# Altium schematic symbol library SCHLIB.SchLib: 2608 symbols (part 13 of 20)
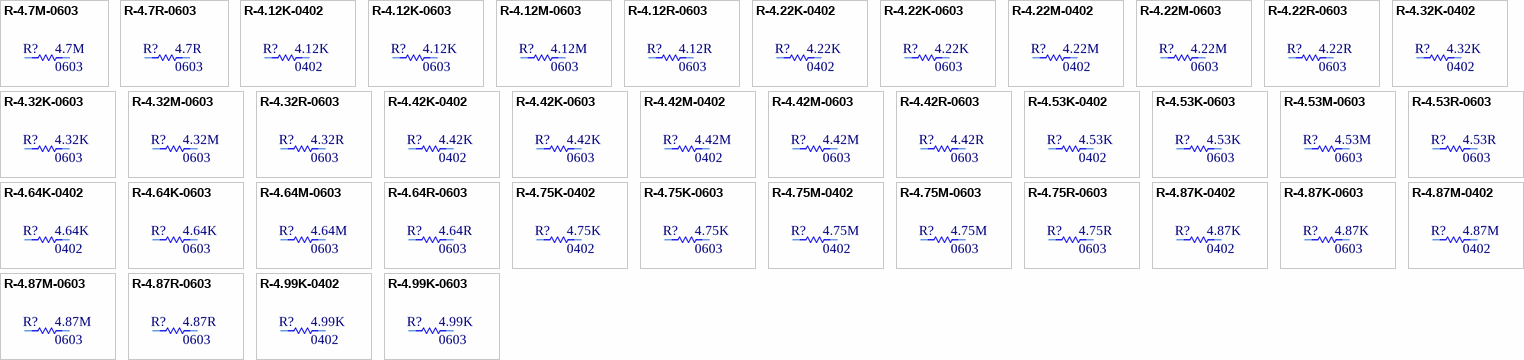
[diagram p95: symbols R-4.7M-0603 to R-4.99K-0603]

## R-4.75M-0402
designator R?, comment Package: 0402  (hidden comment: 4.75M)
RES 4.75M OHM 1% 1/16W 0402; Manufacturer Part Number: RC0402FR-074M75L; Manufacturer: YAGEO; Tolerance: 0.01; Power: 0.063W; Temperature Coefficient: ±100ppm/°C; Object  Type: Part; Design Item ID: R-4.75M-0402; Value: 4.75M; Composition: Thick Film; Features: Moisture Resistant; Operating Temperature: -55°C ~ 155°C; Height - Seated (Max): 0.40mm; Category: Resistor
footprint R0402
pins: 1, 2

## R-4.75M-0603
designator R?, comment Package: 0603  (hidden comment: 4.75M)
RES SMD 4.75M OHM 1% 1/10W 0603; Manufacturer Part Number: CRCW06034M75FKEA; Manufacturer: Vishay Dale; Tolerance: 0.01; Power: 0.1W; Temperature Coefficient: ±100ppm/°C; Object  Type: Part; Design Item ID: R-4.75M-0603; Value: 4.75M; Composition: Thick Film; Features: Automotive AEC-Q200; Operating Temperature: -55°C ~ 155°C; Height - Seated (Max): 0.50mm; Category: Resistor
footprint R0603
pins: 1, 2

## R-4.75R-0603
designator R?, comment Package: 0603  (hidden comment: 4.75R)
RES SMD 4.75 OHM 1% 1/10W 0603; Manufacturer Part Number: CRCW06034R75FKEA; Manufacturer: Vishay Dale; Tolerance: 0.01; Power: 0.1W; Temperature Coefficient: ±100ppm/°C; Object  Type: Part; Design Item ID: R-4.75R-0603; Value: 4.75R; Composition: Thick Film; Features: Automotive AEC-Q200; Operating Temperature: -55°C ~ 155°C; Height - Seated (Max): 0.50mm; Category: Resistor
footprint R0603
pins: 1, 2

## R-4.87K-0402
designator R?, comment Package: 0402  (hidden comment: 4.87K)
RES 4.87K OHM 1% 1/16W 0402; Manufacturer Part Number: RC0402FR-074K87L; Manufacturer: YAGEO; Tolerance: 0.01; Power: 0.063W; Temperature Coefficient: ±100ppm/°C; Object  Type: Part; Design Item ID: R-4.87K-0402; Value: 4.87K; Composition: Thick Film; Features: Moisture Resistant; Operating Temperature: -55°C ~ 155°C; Height - Seated (Max): 0.40mm; Category: Resistor
footprint R0402
pins: 1, 2

## R-4.87K-0603
designator R?, comment Package: 0603  (hidden comment: 4.87K)
RES SMD 4.87K OHM 1% 1/10W 0603; Manufacturer Part Number: CRCW06034K87FKEA; Manufacturer: Vishay Dale; Tolerance: 0.01; Power: 0.1W; Temperature Coefficient: ±100ppm/°C; Object  Type: Part; Design Item ID: R-4.87K-0603; Value: 4.87K; Composition: Thick Film; Features: Automotive AEC-Q200; Operating Temperature: -55°C ~ 155°C; Height - Seated (Max): 0.50mm; Category: Resistor
footprint R0603
pins: 1, 2

## R-4.87M-0402
designator R?, comment Package: 0402  (hidden comment: 4.87M)
RES 4.87M OHM 1% 1/16W 0402; Manufacturer Part Number: RC0402FR-074M87L; Manufacturer: YAGEO; Tolerance: 0.01; Power: 0.063W; Temperature Coefficient: ±100ppm/°C; Object  Type: Part; Design Item ID: R-4.87M-0402; Value: 4.87M; Composition: Thick Film; Features: Moisture Resistant; Operating Temperature: -55°C ~ 155°C; Height - Seated (Max): 0.40mm; Category: Resistor
footprint R0402
pins: 1, 2

## R-4.87M-0603
designator R?, comment Package: 0603  (hidden comment: 4.87M)
RES SMD 4.87M OHM 1% 1/10W 0603; Manufacturer Part Number: CRCW06034M87FKEA; Manufacturer: Vishay Dale; Tolerance: 0.01; Power: 0.1W; Temperature Coefficient: ±100ppm/°C; Object  Type: Part; Design Item ID: R-4.87M-0603; Value: 4.87M; Composition: Thick Film; Features: Automotive AEC-Q200; Operating Temperature: -55°C ~ 155°C; Height - Seated (Max): 0.50mm; Category: Resistor
footprint R0603
pins: 1, 2

## R-4.87R-0603
designator R?, comment Package: 0603  (hidden comment: 4.87R)
RES SMD 4.87 OHM 1% 1/10W 0603; Manufacturer Part Number: CRCW06034R87FKEA; Manufacturer: Vishay Dale; Tolerance: 0.01; Power: 0.1W; Temperature Coefficient: ±100ppm/°C; Object  Type: Part; Design Item ID: R-4.87R-0603; Value: 4.87R; Composition: Thick Film; Features: Automotive AEC-Q200; Operating Temperature: -55°C ~ 155°C; Height - Seated (Max): 0.50mm; Category: Resistor
footprint R0603
pins: 1, 2

## R-4.99K-0402
designator R?, comment Package: 0402  (hidden comment: 4.99K)
RES 4.99K OHM 1% 1/16W 0402; Manufacturer Part Number: RC0402FR-074K99L; Manufacturer: YAGEO; Tolerance: 0.01; Power: 0.063W; Temperature Coefficient: ±100ppm/°C; Object  Type: Part; Design Item ID: R-4.99K-0402; Value: 4.99K; Composition: Thick Film; Features: Moisture Resistant; Operating Temperature: -55°C ~ 155°C; Height - Seated (Max): 0.40mm; Category: Resistor
footprint R0402
pins: 1, 2

## R-4.99K-0603
designator R?, comment Package: 0603  (hidden comment: 4.99K)
RES SMD 4.99K OHM 1% 1/10W 0603; Manufacturer Part Number: CRCW06034K99FKEA; Manufacturer: Vishay Dale; Tolerance: 0.01; Power: 0.1W; Temperature Coefficient: ±100ppm/°C; Object  Type: Part; Design Item ID: R-4.99K-0603; Value: 4.99K; Composition: Thick Film; Features: Automotive AEC-Q200; Operating Temperature: -55°C ~ 155°C; Height - Seated (Max): 0.50mm; Category: Resistor
footprint R0603
pins: 1, 2

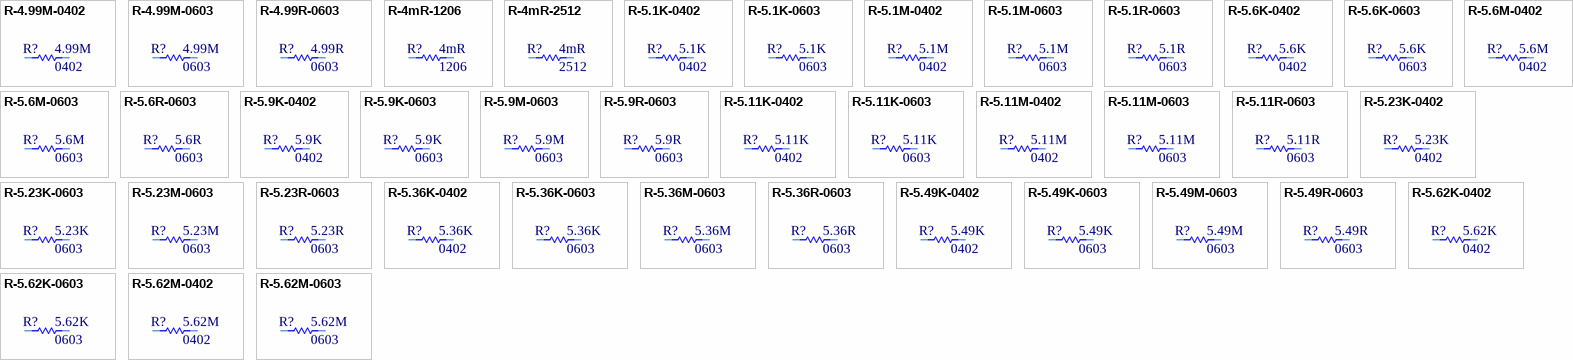
[diagram p53: symbols R-4.99M-0402 to R-5.62M-0603]

## R-4.99M-0402
designator R?, comment Package: 0402  (hidden comment: 4.99M)
RES 4.99M OHM 1% 1/16W 0402; Manufacturer Part Number: RC0402FR-074M99L; Manufacturer: YAGEO; Tolerance: 0.01; Power: 0.063W; Temperature Coefficient: ±100ppm/°C; Object  Type: Part; Design Item ID: R-4.99M-0402; Value: 4.99M; Composition: Thick Film; Features: Moisture Resistant; Operating Temperature: -55°C ~ 155°C; Height - Seated (Max): 0.40mm; Category: Resistor
footprint R0402
pins: 1, 2

## R-4.99M-0603
designator R?, comment Package: 0603  (hidden comment: 4.99M)
RES SMD 4.99M OHM 1% 1/10W 0603; Manufacturer Part Number: CRCW06034M99FKEA; Manufacturer: Vishay Dale; Tolerance: 0.01; Power: 0.1W; Temperature Coefficient: ±100ppm/°C; Object  Type: Part; Design Item ID: R-4.99M-0603; Value: 4.99M; Composition: Thick Film; Features: Automotive AEC-Q200; Operating Temperature: -55°C ~ 155°C; Height - Seated (Max): 0.50mm; Category: Resistor
footprint R0603
pins: 1, 2

## R-4.99R-0603
designator R?, comment Package: 0603  (hidden comment: 4.99R)
RES SMD 4.99 OHM 1% 1/10W 0603; Manufacturer Part Number: CRCW06034R99FKEA; Manufacturer: Vishay Dale; Tolerance: 0.01; Power: 0.1W; Temperature Coefficient: ±100ppm/°C; Object  Type: Part; Design Item ID: R-4.99R-0603; Value: 4.99R; Composition: Thick Film; Features: Automotive AEC-Q200; Operating Temperature: -55°C ~ 155°C; Height - Seated (Max): 0.50mm; Category: Resistor
footprint R0603
pins: 1, 2

## R-4mR-1206
designator R?, comment Package: 1206  (hidden comment: 4mR)
RES 0.004 OHM 1% 1/4W 1206; Manufacturer Part Number: WSL12064L000FEA; Manufacturer: Vishay Dale; Tolerance: 0.01; Power: 0.25W; Temperature Coefficient: ±150ppm/°C; Object  Type: Part; Design Item ID: R-4mR-1206; Value: 4mR; Composition: Metal Element; Features: Anti-Sulfur, Automotive AEC-Q200, Current Sense, Moisture Resistant, Pulse Withstanding; Operating Temperature: -65°C ~ 170°C; Height - Seated (Max): 0.89mm; Category: Resistor
footprint R1206
pins: 1, 2

## R-4mR-2512
designator R?, comment Package: 2512  (hidden comment: 4mR)
RES 0.004 OHM 1% 1W 2512; Manufacturer Part Number: WSL25124L000FEA; Manufacturer: Vishay Dale; Tolerance: 0.01; Temperature Coefficient: ±150ppm/°C; Object  Type: Part; Design Item ID: R-4mR-2512; Value: 4mR; Power: 1W; Composition: Metal Element; Features: Anti-Sulfur, Automotive AEC-Q200, Current Sense, Moisture Resistant, Pulse Withstanding; Operating Temperature: -65°C ~ 170°C; Height - Seated (Max): 0.89mm; Category: Resistor
footprint R2512
pins: 1, 2

## R-5.1K-0402
designator R?, comment Package: 0402  (hidden comment: 5.1K)
RES 5.1K OHM 1% 1/16W 0402; Manufacturer Part Number: RC0402FR-075K1L; Manufacturer: YAGEO; Tolerance: 0.01; Power: 0.063W; Temperature Coefficient: ±100ppm/°C; Object  Type: Part; Design Item ID: R-5.1K-0402; Value: 5.1K; Composition: Thick Film; Features: Moisture Resistant; Operating Temperature: -55°C ~ 155°C; Height - Seated (Max): 0.40mm; Category: Resistor
footprint R0402
pins: 1, 2

## R-5.1K-0603
designator R?, comment Package: 0603  (hidden comment: 5.1K)
RES SMD 5.1K OHM 1% 1/10W 0603; Manufacturer Part Number: CRCW06035K10FKEA; Manufacturer: Vishay Dale; Tolerance: 0.01; Power: 0.1W; Temperature Coefficient: ±100ppm/°C; Object  Type: Part; Design Item ID: R-5.1K-0603; Value: 5.1K; Composition: Thick Film; Features: Automotive AEC-Q200; Operating Temperature: -55°C ~ 155°C; Height - Seated (Max): 0.50mm; Category: Resistor
footprint R0603
pins: 1, 2

## R-5.1M-0402
designator R?, comment Package: 0402  (hidden comment: 5.1M)
RES 5.1M OHM 1% 1/16W 0402; Manufacturer Part Number: RC0402FR-075M1L; Manufacturer: YAGEO; Tolerance: 0.01; Power: 0.063W; Temperature Coefficient: ±100ppm/°C; Object  Type: Part; Design Item ID: R-5.1M-0402; Value: 5.1M; Composition: Thick Film; Features: Moisture Resistant; Operating Temperature: -55°C ~ 155°C; Height - Seated (Max): 0.40mm; Category: Resistor
footprint R0402
pins: 1, 2

## R-5.1M-0603
designator R?, comment Package: 0603  (hidden comment: 5.1M)
RES SMD 5.1M OHM 1% 1/10W 0603; Manufacturer Part Number: CRCW06035M10FKEA; Manufacturer: Vishay Dale; Tolerance: 0.01; Power: 0.1W; Temperature Coefficient: ±100ppm/°C; Object  Type: Part; Design Item ID: R-5.1M-0603; Value: 5.1M; Composition: Thick Film; Features: Automotive AEC-Q200; Operating Temperature: -55°C ~ 155°C; Height - Seated (Max): 0.50mm; Category: Resistor
footprint R0603
pins: 1, 2

## R-5.1R-0603
designator R?, comment Package: 0603  (hidden comment: 5.1R)
RES SMD 5.1 OHM 1% 1/10W 0603; Manufacturer Part Number: CRCW06035R10FKEA; Manufacturer: Vishay Dale; Tolerance: 0.01; Power: 0.1W; Temperature Coefficient: ±100ppm/°C; Object  Type: Part; Design Item ID: R-5.1R-0603; Value: 5.1R; Composition: Thick Film; Features: Automotive AEC-Q200; Operating Temperature: -55°C ~ 155°C; Height - Seated (Max): 0.50mm; Category: Resistor
footprint R0603
pins: 1, 2

## R-5.6K-0402
designator R?, comment Package: 0402  (hidden comment: 5.6K)
RES 5.6K OHM 1% 1/16W 0402; Manufacturer Part Number: RC0402FR-075K6L; Manufacturer: YAGEO; Tolerance: 0.01; Power: 0.063W; Temperature Coefficient: ±100ppm/°C; Object  Type: Part; Design Item ID: R-5.6K-0402; Value: 5.6K; Composition: Thick Film; Features: Moisture Resistant; Operating Temperature: -55°C ~ 155°C; Height - Seated (Max): 0.40mm; Category: Resistor
footprint R0402
pins: 1, 2

## R-5.6K-0603
designator R?, comment Package: 0603  (hidden comment: 5.6K)
RES SMD 5.6K OHM 1% 1/10W 0603; Manufacturer Part Number: CRCW06035K60FKEA; Manufacturer: Vishay Dale; Tolerance: 0.01; Power: 0.1W; Temperature Coefficient: ±100ppm/°C; Object  Type: Part; Design Item ID: R-5.6K-0603; Value: 5.6K; Composition: Thick Film; Features: Automotive AEC-Q200; Operating Temperature: -55°C ~ 155°C; Height - Seated (Max): 0.50mm; Category: Resistor
footprint R0603
pins: 1, 2

## R-5.6M-0402
designator R?, comment Package: 0402  (hidden comment: 5.6M)
RES 5.6M OHM 1% 1/16W 0402; Manufacturer Part Number: RC0402FR-075M6L; Manufacturer: YAGEO; Tolerance: 0.01; Power: 0.063W; Temperature Coefficient: ±100ppm/°C; Object  Type: Part; Design Item ID: R-5.6M-0402; Value: 5.6M; Composition: Thick Film; Features: Moisture Resistant; Operating Temperature: -55°C ~ 155°C; Height - Seated (Max): 0.40mm; Category: Resistor
footprint R0402
pins: 1, 2

## R-5.6M-0603
designator R?, comment Package: 0603  (hidden comment: 5.6M)
RES SMD 5.6M OHM 1% 1/10W 0603; Manufacturer Part Number: CRCW06035M60FKEA; Manufacturer: Vishay Dale; Tolerance: 0.01; Power: 0.1W; Temperature Coefficient: ±100ppm/°C; Object  Type: Part; Design Item ID: R-5.6M-0603; Value: 5.6M; Composition: Thick Film; Features: Automotive AEC-Q200; Operating Temperature: -55°C ~ 155°C; Height - Seated (Max): 0.50mm; Category: Resistor
footprint R0603
pins: 1, 2

## R-5.6R-0603
designator R?, comment Package: 0603  (hidden comment: 5.6R)
RES SMD 5.6 OHM 1% 1/10W 0603; Manufacturer Part Number: CRCW06035R60FKEA; Manufacturer: Vishay Dale; Tolerance: 0.01; Power: 0.1W; Temperature Coefficient: ±100ppm/°C; Object  Type: Part; Design Item ID: R-5.6R-0603; Value: 5.6R; Composition: Thick Film; Features: Automotive AEC-Q200; Operating Temperature: -55°C ~ 155°C; Height - Seated (Max): 0.50mm; Category: Resistor
footprint R0603
pins: 1, 2

## R-5.9K-0402
designator R?, comment Package: 0402  (hidden comment: 5.9K)
RES 5.9K OHM 1% 1/16W 0402; Manufacturer Part Number: RC0402FR-075K9L; Manufacturer: YAGEO; Tolerance: 0.01; Power: 0.063W; Temperature Coefficient: ±100ppm/°C; Object  Type: Part; Design Item ID: R-5.9K-0402; Value: 5.9K; Composition: Thick Film; Features: Moisture Resistant; Operating Temperature: -55°C ~ 155°C; Height - Seated (Max): 0.40mm; Category: Resistor
footprint R0402
pins: 1, 2

## R-5.9K-0603
designator R?, comment Package: 0603  (hidden comment: 5.9K)
RES SMD 5.9K OHM 1% 1/10W 0603; Manufacturer Part Number: CRCW06035K90FKEA; Manufacturer: Vishay Dale; Tolerance: 0.01; Power: 0.1W; Temperature Coefficient: ±100ppm/°C; Object  Type: Part; Design Item ID: R-5.9K-0603; Value: 5.9K; Composition: Thick Film; Features: Automotive AEC-Q200; Operating Temperature: -55°C ~ 155°C; Height - Seated (Max): 0.50mm; Category: Resistor
footprint R0603
pins: 1, 2

## R-5.9M-0603
designator R?, comment Package: 0603  (hidden comment: 5.9M)
RES SMD 5.9M OHM 1% 1/10W 0603; Manufacturer Part Number: CRCW06035M90FKEA; Manufacturer: Vishay Dale; Tolerance: 0.01; Power: 0.1W; Temperature Coefficient: ±100ppm/°C; Object  Type: Part; Design Item ID: R-5.9M-0603; Value: 5.9M; Composition: Thick Film; Features: Automotive AEC-Q200; Operating Temperature: -55°C ~ 155°C; Height - Seated (Max): 0.50mm; Category: Resistor
footprint R0603
pins: 1, 2

## R-5.9R-0603
designator R?, comment Package: 0603  (hidden comment: 5.9R)
RES SMD 5.9 OHM 1% 1/10W 0603; Manufacturer Part Number: CRCW06035R90FKEA; Manufacturer: Vishay Dale; Tolerance: 0.01; Power: 0.1W; Temperature Coefficient: ±100ppm/°C; Object  Type: Part; Design Item ID: R-5.9R-0603; Value: 5.9R; Composition: Thick Film; Features: Automotive AEC-Q200; Operating Temperature: -55°C ~ 155°C; Height - Seated (Max): 0.50mm; Category: Resistor
footprint R0603
pins: 1, 2

## R-5.11K-0402
designator R?, comment Package: 0402  (hidden comment: 5.11K)
RES 5.11K OHM 1% 1/16W 0402; Manufacturer Part Number: RC0402FR-075K11L; Manufacturer: YAGEO; Tolerance: 0.01; Power: 0.063W; Temperature Coefficient: ±100ppm/°C; Object  Type: Part; Design Item ID: R-5.11K-0402; Value: 5.11K; Composition: Thick Film; Features: Moisture Resistant; Operating Temperature: -55°C ~ 155°C; Height - Seated (Max): 0.40mm; Category: Resistor
footprint R0402
pins: 1, 2

## R-5.11K-0603
designator R?, comment Package: 0603  (hidden comment: 5.11K)
RES SMD 5.11K OHM 1% 1/10W 0603; Manufacturer Part Number: CRCW06035K11FKEA; Manufacturer: Vishay Dale; Tolerance: 0.01; Power: 0.1W; Temperature Coefficient: ±100ppm/°C; Object  Type: Part; Design Item ID: R-5.11K-0603; Value: 5.11K; Composition: Thick Film; Features: Automotive AEC-Q200; Operating Temperature: -55°C ~ 155°C; Height - Seated (Max): 0.50mm; Category: Resistor
footprint R0603
pins: 1, 2

## R-5.11M-0402
designator R?, comment Package: 0402  (hidden comment: 5.11M)
RES 5.11M OHM 1% 1/16W 0402; Manufacturer Part Number: RC0402FR-075M11L; Manufacturer: YAGEO; Tolerance: 0.01; Power: 0.063W; Temperature Coefficient: ±100ppm/°C; Object  Type: Part; Design Item ID: R-5.11M-0402; Value: 5.11M; Composition: Thick Film; Features: Moisture Resistant; Operating Temperature: -55°C ~ 155°C; Height - Seated (Max): 0.40mm; Category: Resistor
footprint R0402
pins: 1, 2

## R-5.11M-0603
designator R?, comment Package: 0603  (hidden comment: 5.11M)
RES SMD 5.11M OHM 1% 1/10W 0603; Manufacturer Part Number: CRCW06035M11FKEA; Manufacturer: Vishay Dale; Tolerance: 0.01; Power: 0.1W; Temperature Coefficient: ±100ppm/°C; Object  Type: Part; Design Item ID: R-5.11M-0603; Value: 5.11M; Composition: Thick Film; Features: Automotive AEC-Q200; Operating Temperature: -55°C ~ 155°C; Height - Seated (Max): 0.50mm; Category: Resistor
footprint R0603
pins: 1, 2

## R-5.11R-0603
designator R?, comment Package: 0603  (hidden comment: 5.11R)
RES SMD 5.11 OHM 1% 1/10W 0603; Manufacturer Part Number: CRCW06035R11FKEA; Manufacturer: Vishay Dale; Tolerance: 0.01; Power: 0.1W; Temperature Coefficient: ±100ppm/°C; Object  Type: Part; Design Item ID: R-5.11R-0603; Value: 5.11R; Composition: Thick Film; Features: Automotive AEC-Q200; Operating Temperature: -55°C ~ 155°C; Height - Seated (Max): 0.50mm; Category: Resistor
footprint R0603
pins: 1, 2

## R-5.23K-0402
designator R?, comment Package: 0402  (hidden comment: 5.23K)
RES 5.23K OHM 1% 1/16W 0402; Manufacturer Part Number: RC0402FR-075K23L; Manufacturer: YAGEO; Tolerance: 0.01; Power: 0.063W; Temperature Coefficient: ±100ppm/°C; Object  Type: Part; Design Item ID: R-5.23K-0402; Value: 5.23K; Composition: Thick Film; Features: Moisture Resistant; Operating Temperature: -55°C ~ 155°C; Height - Seated (Max): 0.40mm; Category: Resistor
footprint R0402
pins: 1, 2

## R-5.23K-0603
designator R?, comment Package: 0603  (hidden comment: 5.23K)
RES SMD 5.23K OHM 1% 1/10W 0603; Manufacturer Part Number: CRCW06035K23FKEA; Manufacturer: Vishay Dale; Tolerance: 0.01; Power: 0.1W; Temperature Coefficient: ±100ppm/°C; Object  Type: Part; Design Item ID: R-5.23K-0603; Value: 5.23K; Composition: Thick Film; Features: Automotive AEC-Q200; Operating Temperature: -55°C ~ 155°C; Height - Seated (Max): 0.50mm; Category: Resistor
footprint R0603
pins: 1, 2

## R-5.23M-0603
designator R?, comment Package: 0603  (hidden comment: 5.23M)
RES SMD 5.23M OHM 1% 1/10W 0603; Manufacturer Part Number: CRCW06035M23FKEA; Manufacturer: Vishay Dale; Tolerance: 0.01; Power: 0.1W; Temperature Coefficient: ±100ppm/°C; Object  Type: Part; Design Item ID: R-5.23M-0603; Value: 5.23M; Composition: Thick Film; Features: Automotive AEC-Q200; Operating Temperature: -55°C ~ 155°C; Height - Seated (Max): 0.50mm; Category: Resistor
footprint R0603
pins: 1, 2

## R-5.23R-0603
designator R?, comment Package: 0603  (hidden comment: 5.23R)
RES SMD 5.23 OHM 1% 1/10W 0603; Manufacturer Part Number: CRCW06035R23FKEA; Manufacturer: Vishay Dale; Tolerance: 0.01; Power: 0.1W; Temperature Coefficient: ±100ppm/°C; Object  Type: Part; Design Item ID: R-5.23R-0603; Value: 5.23R; Composition: Thick Film; Features: Automotive AEC-Q200; Operating Temperature: -55°C ~ 155°C; Height - Seated (Max): 0.50mm; Category: Resistor
footprint R0603
pins: 1, 2

## R-5.36K-0402
designator R?, comment Package: 0402  (hidden comment: 5.36K)
RES 5.36K OHM 1% 1/16W 0402; Manufacturer Part Number: RC0402FR-075K36L; Manufacturer: YAGEO; Tolerance: 0.01; Power: 0.063W; Temperature Coefficient: ±100ppm/°C; Object  Type: Part; Design Item ID: R-5.36K-0402; Value: 5.36K; Composition: Thick Film; Features: Moisture Resistant; Operating Temperature: -55°C ~ 155°C; Height - Seated (Max): 0.40mm; Category: Resistor
footprint R0402
pins: 1, 2

## R-5.36K-0603
designator R?, comment Package: 0603  (hidden comment: 5.36K)
RES SMD 5.36K OHM 1% 1/10W 0603; Manufacturer Part Number: CRCW06035K36FKEA; Manufacturer: Vishay Dale; Tolerance: 0.01; Power: 0.1W; Temperature Coefficient: ±100ppm/°C; Object  Type: Part; Design Item ID: R-5.36K-0603; Value: 5.36K; Composition: Thick Film; Features: Automotive AEC-Q200; Operating Temperature: -55°C ~ 155°C; Height - Seated (Max): 0.50mm; Category: Resistor
footprint R0603
pins: 1, 2

## R-5.36M-0603
designator R?, comment Package: 0603  (hidden comment: 5.36M)
RES SMD 5.36M OHM 1% 1/10W 0603; Manufacturer Part Number: CRCW06035M36FKEA; Manufacturer: Vishay Dale; Tolerance: 0.01; Power: 0.1W; Temperature Coefficient: ±100ppm/°C; Object  Type: Part; Design Item ID: R-5.36M-0603; Value: 5.36M; Composition: Thick Film; Features: Automotive AEC-Q200; Operating Temperature: -55°C ~ 155°C; Height - Seated (Max): 0.50mm; Category: Resistor
footprint R0603
pins: 1, 2

## R-5.36R-0603
designator R?, comment Package: 0603  (hidden comment: 5.36R)
RES SMD 5.36 OHM 1% 1/10W 0603; Manufacturer Part Number: CRCW06035R36FKEA; Manufacturer: Vishay Dale; Tolerance: 0.01; Power: 0.1W; Temperature Coefficient: ±100ppm/°C; Object  Type: Part; Design Item ID: R-5.36R-0603; Value: 5.36R; Composition: Thick Film; Features: Automotive AEC-Q200; Operating Temperature: -55°C ~ 155°C; Height - Seated (Max): 0.50mm; Category: Resistor
footprint R0603
pins: 1, 2

## R-5.49K-0402
designator R?, comment Package: 0402  (hidden comment: 5.49K)
RES 5.49K OHM 1% 1/16W 0402; Manufacturer Part Number: RC0402FR-075K49L; Manufacturer: YAGEO; Tolerance: 0.01; Power: 0.063W; Temperature Coefficient: ±100ppm/°C; Object  Type: Part; Design Item ID: R-5.49K-0402; Value: 5.49K; Composition: Thick Film; Features: Moisture Resistant; Operating Temperature: -55°C ~ 155°C; Height - Seated (Max): 0.40mm; Category: Resistor
footprint R0402
pins: 1, 2

## R-5.49K-0603
designator R?, comment Package: 0603  (hidden comment: 5.49K)
RES SMD 5.49K OHM 1% 1/10W 0603; Manufacturer Part Number: CRCW06035K49FKEA; Manufacturer: Vishay Dale; Tolerance: 0.01; Power: 0.1W; Temperature Coefficient: ±100ppm/°C; Object  Type: Part; Design Item ID: R-5.49K-0603; Value: 5.49K; Composition: Thick Film; Features: Automotive AEC-Q200; Operating Temperature: -55°C ~ 155°C; Height - Seated (Max): 0.50mm; Category: Resistor
footprint R0603
pins: 1, 2

## R-5.49M-0603
designator R?, comment Package: 0603  (hidden comment: 5.49M)
RES SMD 5.49M OHM 1% 1/10W 0603; Manufacturer Part Number: CRCW06035M49FKEA; Manufacturer: Vishay Dale; Tolerance: 0.01; Power: 0.1W; Temperature Coefficient: ±100ppm/°C; Object  Type: Part; Design Item ID: R-5.49M-0603; Value: 5.49M; Composition: Thick Film; Features: Automotive AEC-Q200; Operating Temperature: -55°C ~ 155°C; Height - Seated (Max): 0.50mm; Category: Resistor
footprint R0603
pins: 1, 2

## R-5.49R-0603
designator R?, comment Package: 0603  (hidden comment: 5.49R)
RES SMD 5.49 OHM 1% 1/10W 0603; Manufacturer Part Number: CRCW06035R49FKEA; Manufacturer: Vishay Dale; Tolerance: 0.01; Power: 0.1W; Temperature Coefficient: ±100ppm/°C; Object  Type: Part; Design Item ID: R-5.49R-0603; Value: 5.49R; Composition: Thick Film; Features: Automotive AEC-Q200; Operating Temperature: -55°C ~ 155°C; Height - Seated (Max): 0.50mm; Category: Resistor
footprint R0603
pins: 1, 2

## R-5.62K-0402
designator R?, comment Package: 0402  (hidden comment: 5.62K)
RES 5.62K OHM 1% 1/16W 0402; Manufacturer Part Number: RC0402FR-075K62L; Manufacturer: YAGEO; Tolerance: 0.01; Power: 0.063W; Temperature Coefficient: ±100ppm/°C; Object  Type: Part; Design Item ID: R-5.62K-0402; Value: 5.62K; Composition: Thick Film; Features: Moisture Resistant; Operating Temperature: -55°C ~ 155°C; Height - Seated (Max): 0.40mm; Category: Resistor
footprint R0402
pins: 1, 2

## R-5.62K-0603
designator R?, comment Package: 0603  (hidden comment: 5.62K)
RES SMD 5.62K OHM 1% 1/10W 0603; Manufacturer Part Number: CRCW06035K62FKEA; Manufacturer: Vishay Dale; Tolerance: 0.01; Power: 0.1W; Temperature Coefficient: ±100ppm/°C; Object  Type: Part; Design Item ID: R-5.62K-0603; Value: 5.62K; Composition: Thick Film; Features: Automotive AEC-Q200; Operating Temperature: -55°C ~ 155°C; Height - Seated (Max): 0.50mm; Category: Resistor
footprint R0603
pins: 1, 2

## R-5.62M-0402
designator R?, comment Package: 0402  (hidden comment: 5.62M)
RES 5.62M OHM 1% 1/16W 0402; Manufacturer Part Number: RC0402FR-075M62L; Manufacturer: YAGEO; Tolerance: 0.01; Power: 0.063W; Temperature Coefficient: ±100ppm/°C; Object  Type: Part; Design Item ID: R-5.62M-0402; Value: 5.62M; Composition: Thick Film; Features: Moisture Resistant; Operating Temperature: -55°C ~ 155°C; Height - Seated (Max): 0.40mm; Category: Resistor
footprint R0402
pins: 1, 2

## R-5.62M-0603
designator R?, comment Package: 0603  (hidden comment: 5.62M)
RES SMD 5.62M OHM 1% 1/10W 0603; Manufacturer Part Number: CRCW06035M62FKEA; Manufacturer: Vishay Dale; Tolerance: 0.01; Power: 0.1W; Temperature Coefficient: ±100ppm/°C; Object  Type: Part; Design Item ID: R-5.62M-0603; Value: 5.62M; Composition: Thick Film; Features: Automotive AEC-Q200; Operating Temperature: -55°C ~ 155°C; Height - Seated (Max): 0.50mm; Category: Resistor
footprint R0603
pins: 1, 2

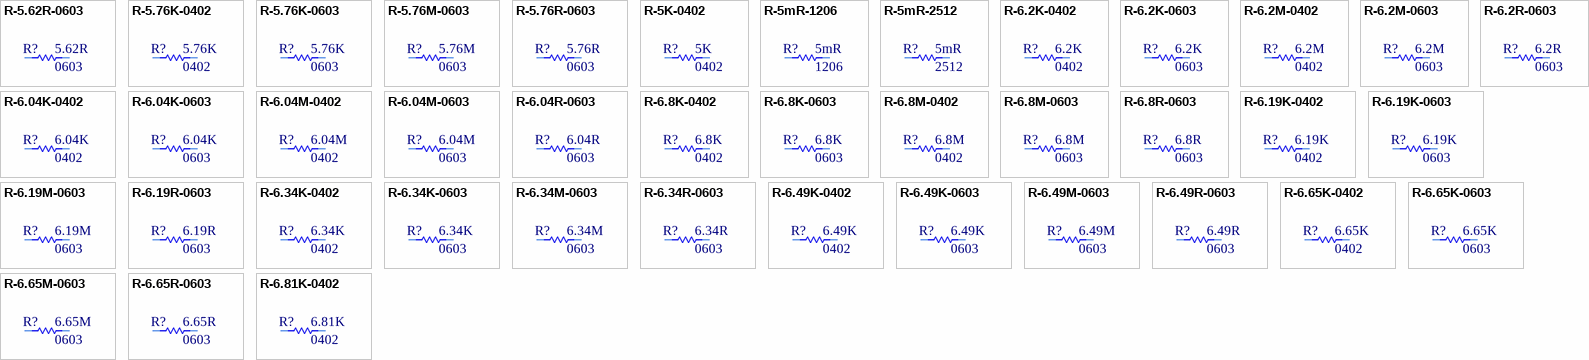
[diagram p54: symbols R-5.62R-0603 to R-6.81K-0402]

## R-5.62R-0603
designator R?, comment Package: 0603  (hidden comment: 5.62R)
RES SMD 5.62 OHM 1% 1/10W 0603; Manufacturer Part Number: CRCW06035R62FKEA; Manufacturer: Vishay Dale; Tolerance: 0.01; Power: 0.1W; Temperature Coefficient: ±100ppm/°C; Object  Type: Part; Design Item ID: R-5.62R-0603; Value: 5.62R; Composition: Thick Film; Features: Automotive AEC-Q200; Operating Temperature: -55°C ~ 155°C; Height - Seated (Max): 0.50mm; Category: Resistor
footprint R0603
pins: 1, 2

## R-5.76K-0402
designator R?, comment Package: 0402  (hidden comment: 5.76K)
RES 5.76K OHM 1% 1/16W 0402; Manufacturer Part Number: RC0402FR-075K76L; Manufacturer: YAGEO; Tolerance: 0.01; Power: 0.063W; Temperature Coefficient: ±100ppm/°C; Object  Type: Part; Design Item ID: R-5.76K-0402; Value: 5.76K; Composition: Thick Film; Features: Moisture Resistant; Operating Temperature: -55°C ~ 155°C; Height - Seated (Max): 0.40mm; Category: Resistor
footprint R0402
pins: 1, 2

## R-5.76K-0603
designator R?, comment Package: 0603  (hidden comment: 5.76K)
RES SMD 5.76K OHM 1% 1/10W 0603; Manufacturer Part Number: CRCW06035K76FKEA; Manufacturer: Vishay Dale; Tolerance: 0.01; Power: 0.1W; Temperature Coefficient: ±100ppm/°C; Object  Type: Part; Design Item ID: R-5.76K-0603; Value: 5.76K; Composition: Thick Film; Features: Automotive AEC-Q200; Operating Temperature: -55°C ~ 155°C; Height - Seated (Max): 0.50mm; Category: Resistor
footprint R0603
pins: 1, 2

## R-5.76M-0603
designator R?, comment Package: 0603  (hidden comment: 5.76M)
RES SMD 5.76M OHM 1% 1/10W 0603; Manufacturer Part Number: CRCW06035M76FKEA; Manufacturer: Vishay Dale; Tolerance: 0.01; Power: 0.1W; Temperature Coefficient: ±100ppm/°C; Object  Type: Part; Design Item ID: R-5.76M-0603; Value: 5.76M; Composition: Thick Film; Features: Automotive AEC-Q200; Operating Temperature: -55°C ~ 155°C; Height - Seated (Max): 0.50mm; Category: Resistor
footprint R0603
pins: 1, 2

## R-5.76R-0603
designator R?, comment Package: 0603  (hidden comment: 5.76R)
RES SMD 5.76 OHM 1% 1/10W 0603; Manufacturer Part Number: CRCW06035R76FKEA; Manufacturer: Vishay Dale; Tolerance: 0.01; Power: 0.1W; Temperature Coefficient: ±100ppm/°C; Object  Type: Part; Design Item ID: R-5.76R-0603; Value: 5.76R; Composition: Thick Film; Features: Automotive AEC-Q200; Operating Temperature: -55°C ~ 155°C; Height - Seated (Max): 0.50mm; Category: Resistor
footprint R0603
pins: 1, 2

## R-5K-0402
designator R?, comment Package: 0402  (hidden comment: 5K)
RES 5K OHM 1% 1/16W 0402; Manufacturer Part Number: RC0402FR-075KL; Manufacturer: YAGEO; Tolerance: 0.01; Power: 0.063W; Temperature Coefficient: ±100ppm/°C; Object  Type: Part; Design Item ID: R-5K-0402; Value: 5K; Composition: Thick Film; Features: Moisture Resistant; Operating Temperature: -55°C ~ 155°C; Height - Seated (Max): 0.40mm; Category: Resistor
footprint R0402
pins: 1, 2

## R-5mR-1206
designator R?, comment Package: 1206  (hidden comment: 5mR)
RES 0.005 OHM 1% 1/4W 1206; Manufacturer Part Number: WSL12065L000FEA; Manufacturer: Vishay Dale; Tolerance: 0.01; Power: 0.25W; Temperature Coefficient: ±110ppm/°C; Object  Type: Part; Design Item ID: R-5mR-1206; Value: 5mR; Composition: Metal Element; Features: Anti-Sulfur, Automotive AEC-Q200, Current Sense, Moisture Resistant, Pulse Withstanding; Operating Temperature: -65°C ~ 170°C; Height - Seated (Max): 0.89mm; Category: Resistor
footprint R1206
pins: 1, 2

## R-5mR-2512
designator R?, comment Package: 2512  (hidden comment: 5mR)
RES 0.005 OHM 1% 1W 2512; Manufacturer Part Number: WSL25125L000FEA; Manufacturer: Vishay Dale; Tolerance: 0.01; Temperature Coefficient: ±110ppm/°C; Object  Type: Part; Design Item ID: R-5mR-2512; Value: 5mR; Power: 1W; Composition: Metal Element; Features: Anti-Sulfur, Automotive AEC-Q200, Current Sense, Moisture Resistant, Pulse Withstanding; Operating Temperature: -65°C ~ 170°C; Height - Seated (Max): 0.89mm; Category: Resistor
footprint R2512
pins: 1, 2

## R-6.2K-0402
designator R?, comment Package: 0402  (hidden comment: 6.2K)
RES 6.2K OHM 1% 1/16W 0402; Manufacturer Part Number: RC0402FR-076K2L; Manufacturer: YAGEO; Tolerance: 0.01; Power: 0.063W; Temperature Coefficient: ±100ppm/°C; Object  Type: Part; Design Item ID: R-6.2K-0402; Value: 6.2K; Composition: Thick Film; Features: Moisture Resistant; Operating Temperature: -55°C ~ 155°C; Height - Seated (Max): 0.40mm; Category: Resistor
footprint R0402
pins: 1, 2

## R-6.2K-0603
designator R?, comment Package: 0603  (hidden comment: 6.2K)
RES SMD 6.2K OHM 1% 1/10W 0603; Manufacturer Part Number: CRCW06036K20FKEA; Manufacturer: Vishay Dale; Tolerance: 0.01; Power: 0.1W; Temperature Coefficient: ±100ppm/°C; Object  Type: Part; Design Item ID: R-6.2K-0603; Value: 6.2K; Composition: Thick Film; Features: Automotive AEC-Q200; Operating Temperature: -55°C ~ 155°C; Height - Seated (Max): 0.50mm; Category: Resistor
footprint R0603
pins: 1, 2

## R-6.2M-0402
designator R?, comment Package: 0402  (hidden comment: 6.2M)
RES 6.2M OHM 1% 1/16W 0402; Manufacturer Part Number: RC0402FR-076M2L; Manufacturer: YAGEO; Tolerance: 0.01; Power: 0.063W; Temperature Coefficient: ±100ppm/°C; Object  Type: Part; Design Item ID: R-6.2M-0402; Value: 6.2M; Composition: Thick Film; Features: Moisture Resistant; Operating Temperature: -55°C ~ 155°C; Height - Seated (Max): 0.40mm; Category: Resistor
footprint R0402
pins: 1, 2

## R-6.2M-0603
designator R?, comment Package: 0603  (hidden comment: 6.2M)
RES SMD 6.2M OHM 1% 1/10W 0603; Manufacturer Part Number: CRCW06036M20FKEA; Manufacturer: Vishay Dale; Tolerance: 0.01; Power: 0.1W; Temperature Coefficient: ±100ppm/°C; Object  Type: Part; Design Item ID: R-6.2M-0603; Value: 6.2M; Composition: Thick Film; Features: Automotive AEC-Q200; Operating Temperature: -55°C ~ 155°C; Height - Seated (Max): 0.50mm; Category: Resistor
footprint R0603
pins: 1, 2

## R-6.2R-0603
designator R?, comment Package: 0603  (hidden comment: 6.2R)
RES SMD 6.2 OHM 1% 1/10W 0603; Manufacturer Part Number: CRCW06036R20FKEA; Manufacturer: Vishay Dale; Tolerance: 0.01; Power: 0.1W; Temperature Coefficient: ±100ppm/°C; Object  Type: Part; Design Item ID: R-6.2R-0603; Value: 6.2R; Composition: Thick Film; Features: Automotive AEC-Q200; Operating Temperature: -55°C ~ 155°C; Height - Seated (Max): 0.50mm; Category: Resistor
footprint R0603
pins: 1, 2

## R-6.04K-0402
designator R?, comment Package: 0402  (hidden comment: 6.04K)
RES 6.04K OHM 1% 1/16W 0402; Manufacturer Part Number: RC0402FR-076K04L; Manufacturer: YAGEO; Tolerance: 0.01; Power: 0.063W; Temperature Coefficient: ±100ppm/°C; Object  Type: Part; Design Item ID: R-6.04K-0402; Value: 6.04K; Composition: Thick Film; Features: Moisture Resistant; Operating Temperature: -55°C ~ 155°C; Height - Seated (Max): 0.40mm; Category: Resistor
footprint R0402
pins: 1, 2

## R-6.04K-0603
designator R?, comment Package: 0603  (hidden comment: 6.04K)
RES SMD 6.04K OHM 1% 1/10W 0603; Manufacturer Part Number: CRCW06036K04FKEA; Manufacturer: Vishay Dale; Tolerance: 0.01; Power: 0.1W; Temperature Coefficient: ±100ppm/°C; Object  Type: Part; Design Item ID: R-6.04K-0603; Value: 6.04K; Composition: Thick Film; Features: Automotive AEC-Q200; Operating Temperature: -55°C ~ 155°C; Height - Seated (Max): 0.50mm; Category: Resistor
footprint R0603
pins: 1, 2

## R-6.04M-0402
designator R?, comment Package: 0402  (hidden comment: 6.04M)
RES 6.04M OHM 1% 1/16W 0402; Manufacturer Part Number: RC0402FR-076M04L; Manufacturer: YAGEO; Tolerance: 0.01; Power: 0.063W; Temperature Coefficient: ±100ppm/°C; Object  Type: Part; Design Item ID: R-6.04M-0402; Value: 6.04M; Composition: Thick Film; Features: Moisture Resistant; Operating Temperature: -55°C ~ 155°C; Height - Seated (Max): 0.40mm; Category: Resistor
footprint R0402
pins: 1, 2

## R-6.04M-0603
designator R?, comment Package: 0603  (hidden comment: 6.04M)
RES SMD 6.04M OHM 1% 1/10W 0603; Manufacturer Part Number: CRCW06036M04FKEA; Manufacturer: Vishay Dale; Tolerance: 0.01; Power: 0.1W; Temperature Coefficient: ±100ppm/°C; Object  Type: Part; Design Item ID: R-6.04M-0603; Value: 6.04M; Composition: Thick Film; Features: Automotive AEC-Q200; Operating Temperature: -55°C ~ 155°C; Height - Seated (Max): 0.50mm; Category: Resistor
footprint R0603
pins: 1, 2

## R-6.04R-0603
designator R?, comment Package: 0603  (hidden comment: 6.04R)
RES SMD 6.04 OHM 1% 1/10W 0603; Manufacturer Part Number: CRCW06036R04FKEA; Manufacturer: Vishay Dale; Tolerance: 0.01; Power: 0.1W; Temperature Coefficient: ±100ppm/°C; Object  Type: Part; Design Item ID: R-6.04R-0603; Value: 6.04R; Composition: Thick Film; Features: Automotive AEC-Q200; Operating Temperature: -55°C ~ 155°C; Height - Seated (Max): 0.50mm; Category: Resistor
footprint R0603
pins: 1, 2

## R-6.8K-0402
designator R?, comment Package: 0402  (hidden comment: 6.8K)
RES 6.8K OHM 1% 1/16W 0402; Manufacturer Part Number: RC0402FR-076K8L; Manufacturer: YAGEO; Tolerance: 0.01; Power: 0.063W; Temperature Coefficient: ±100ppm/°C; Object  Type: Part; Design Item ID: R-6.8K-0402; Value: 6.8K; Composition: Thick Film; Features: Moisture Resistant; Operating Temperature: -55°C ~ 155°C; Height - Seated (Max): 0.40mm; Category: Resistor
footprint R0402
pins: 1, 2

## R-6.8K-0603
designator R?, comment Package: 0603  (hidden comment: 6.8K)
RES SMD 6.8K OHM 1% 1/10W 0603; Manufacturer Part Number: CRCW06036K80FKEA; Manufacturer: Vishay Dale; Tolerance: 0.01; Power: 0.1W; Temperature Coefficient: ±100ppm/°C; Object  Type: Part; Design Item ID: R-6.8K-0603; Value: 6.8K; Composition: Thick Film; Features: Automotive AEC-Q200; Operating Temperature: -55°C ~ 155°C; Height - Seated (Max): 0.50mm; Category: Resistor
footprint R0603
pins: 1, 2

## R-6.8M-0402
designator R?, comment Package: 0402  (hidden comment: 6.8M)
RES 6.8M OHM 1% 1/16W 0402; Manufacturer Part Number: RC0402FR-076M8L; Manufacturer: YAGEO; Tolerance: 0.01; Power: 0.063W; Temperature Coefficient: ±100ppm/°C; Object  Type: Part; Design Item ID: R-6.8M-0402; Value: 6.8M; Composition: Thick Film; Features: Moisture Resistant; Operating Temperature: -55°C ~ 155°C; Height - Seated (Max): 0.40mm; Category: Resistor
footprint R0402
pins: 1, 2

## R-6.8M-0603
designator R?, comment Package: 0603  (hidden comment: 6.8M)
RES SMD 6.8M OHM 1% 1/10W 0603; Manufacturer Part Number: CRCW06036M80FKEA; Manufacturer: Vishay Dale; Tolerance: 0.01; Power: 0.1W; Temperature Coefficient: ±100ppm/°C; Object  Type: Part; Design Item ID: R-6.8M-0603; Value: 6.8M; Composition: Thick Film; Features: Automotive AEC-Q200; Operating Temperature: -55°C ~ 155°C; Height - Seated (Max): 0.50mm; Category: Resistor
footprint R0603
pins: 1, 2

## R-6.8R-0603
designator R?, comment Package: 0603  (hidden comment: 6.8R)
RES SMD 6.8 OHM 1% 1/10W 0603; Manufacturer Part Number: CRCW06036R80FKEA; Manufacturer: Vishay Dale; Tolerance: 0.01; Power: 0.1W; Temperature Coefficient: ±100ppm/°C; Object  Type: Part; Design Item ID: R-6.8R-0603; Value: 6.8R; Composition: Thick Film; Features: Automotive AEC-Q200; Operating Temperature: -55°C ~ 155°C; Height - Seated (Max): 0.50mm; Category: Resistor
footprint R0603
pins: 1, 2

## R-6.19K-0402
designator R?, comment Package: 0402  (hidden comment: 6.19K)
RES 6.19K OHM 1% 1/16W 0402; Manufacturer Part Number: RC0402FR-076K19L; Manufacturer: YAGEO; Tolerance: 0.01; Power: 0.063W; Temperature Coefficient: ±100ppm/°C; Object  Type: Part; Design Item ID: R-6.19K-0402; Value: 6.19K; Composition: Thick Film; Features: Moisture Resistant; Operating Temperature: -55°C ~ 155°C; Height - Seated (Max): 0.40mm; Category: Resistor
footprint R0402
pins: 1, 2

## R-6.19K-0603
designator R?, comment Package: 0603  (hidden comment: 6.19K)
RES SMD 6.19K OHM 1% 1/10W 0603; Manufacturer Part Number: CRCW06036K19FKEA; Manufacturer: Vishay Dale; Tolerance: 0.01; Power: 0.1W; Temperature Coefficient: ±100ppm/°C; Object  Type: Part; Design Item ID: R-6.19K-0603; Value: 6.19K; Composition: Thick Film; Features: Automotive AEC-Q200; Operating Temperature: -55°C ~ 155°C; Height - Seated (Max): 0.50mm; Category: Resistor
footprint R0603
pins: 1, 2

## R-6.19M-0603
designator R?, comment Package: 0603  (hidden comment: 6.19M)
RES SMD 6.19M OHM 1% 1/10W 0603; Manufacturer Part Number: CRCW06036M19FKEA; Manufacturer: Vishay Dale; Tolerance: 0.01; Power: 0.1W; Temperature Coefficient: ±100ppm/°C; Object  Type: Part; Design Item ID: R-6.19M-0603; Value: 6.19M; Composition: Thick Film; Features: Automotive AEC-Q200; Operating Temperature: -55°C ~ 155°C; Height - Seated (Max): 0.50mm; Category: Resistor
footprint R0603
pins: 1, 2

## R-6.19R-0603
designator R?, comment Package: 0603  (hidden comment: 6.19R)
RES SMD 6.19 OHM 1% 1/10W 0603; Manufacturer Part Number: CRCW06036R19FKEA; Manufacturer: Vishay Dale; Tolerance: 0.01; Power: 0.1W; Temperature Coefficient: ±100ppm/°C; Object  Type: Part; Design Item ID: R-6.19R-0603; Value: 6.19R; Composition: Thick Film; Features: Automotive AEC-Q200; Operating Temperature: -55°C ~ 155°C; Height - Seated (Max): 0.50mm; Category: Resistor
footprint R0603
pins: 1, 2

## R-6.34K-0402
designator R?, comment Package: 0402  (hidden comment: 6.34K)
RES 6.34K OHM 1% 1/16W 0402; Manufacturer Part Number: RC0402FR-076K34L; Manufacturer: YAGEO; Tolerance: 0.01; Power: 0.063W; Temperature Coefficient: ±100ppm/°C; Object  Type: Part; Design Item ID: R-6.34K-0402; Value: 6.34K; Composition: Thick Film; Features: Moisture Resistant; Operating Temperature: -55°C ~ 155°C; Height - Seated (Max): 0.40mm; Category: Resistor
footprint R0402
pins: 1, 2

## R-6.34K-0603
designator R?, comment Package: 0603  (hidden comment: 6.34K)
RES SMD 6.34K OHM 1% 1/10W 0603; Manufacturer Part Number: CRCW06036K34FKEA; Manufacturer: Vishay Dale; Tolerance: 0.01; Power: 0.1W; Temperature Coefficient: ±100ppm/°C; Object  Type: Part; Design Item ID: R-6.34K-0603; Value: 6.34K; Composition: Thick Film; Features: Automotive AEC-Q200; Operating Temperature: -55°C ~ 155°C; Height - Seated (Max): 0.50mm; Category: Resistor
footprint R0603
pins: 1, 2

## R-6.34M-0603
designator R?, comment Package: 0603  (hidden comment: 6.34M)
RES SMD 6.34M OHM 1% 1/10W 0603; Manufacturer Part Number: CRCW06036M34FKEA; Manufacturer: Vishay Dale; Tolerance: 0.01; Power: 0.1W; Temperature Coefficient: ±100ppm/°C; Object  Type: Part; Design Item ID: R-6.34M-0603; Value: 6.34M; Composition: Thick Film; Features: Automotive AEC-Q200; Operating Temperature: -55°C ~ 155°C; Height - Seated (Max): 0.50mm; Category: Resistor
footprint R0603
pins: 1, 2

## R-6.34R-0603
designator R?, comment Package: 0603  (hidden comment: 6.34R)
RES SMD 6.34 OHM 1% 1/10W 0603; Manufacturer Part Number: CRCW06036R34FKEA; Manufacturer: Vishay Dale; Tolerance: 0.01; Power: 0.1W; Temperature Coefficient: ±100ppm/°C; Object  Type: Part; Design Item ID: R-6.34R-0603; Value: 6.34R; Composition: Thick Film; Features: Automotive AEC-Q200; Operating Temperature: -55°C ~ 155°C; Height - Seated (Max): 0.50mm; Category: Resistor
footprint R0603
pins: 1, 2

## R-6.49K-0402
designator R?, comment Package: 0402  (hidden comment: 6.49K)
RES 6.49K OHM 1% 1/16W 0402; Manufacturer Part Number: RC0402FR-076K49L; Manufacturer: YAGEO; Tolerance: 0.01; Power: 0.063W; Temperature Coefficient: ±100ppm/°C; Object  Type: Part; Design Item ID: R-6.49K-0402; Value: 6.49K; Composition: Thick Film; Features: Moisture Resistant; Operating Temperature: -55°C ~ 155°C; Height - Seated (Max): 0.40mm; Category: Resistor
footprint R0402
pins: 1, 2

## R-6.49K-0603
designator R?, comment Package: 0603  (hidden comment: 6.49K)
RES SMD 6.49K OHM 1% 1/10W 0603; Manufacturer Part Number: CRCW06036K49FKEA; Manufacturer: Vishay Dale; Tolerance: 0.01; Power: 0.1W; Temperature Coefficient: ±100ppm/°C; Object  Type: Part; Design Item ID: R-6.49K-0603; Value: 6.49K; Composition: Thick Film; Features: Automotive AEC-Q200; Operating Temperature: -55°C ~ 155°C; Height - Seated (Max): 0.50mm; Category: Resistor
footprint R0603
pins: 1, 2

## R-6.49M-0603
designator R?, comment Package: 0603  (hidden comment: 6.49M)
RES SMD 6.49M OHM 1% 1/10W 0603; Manufacturer Part Number: CRCW06036M49FKEA; Manufacturer: Vishay Dale; Tolerance: 0.01; Power: 0.1W; Temperature Coefficient: ±100ppm/°C; Object  Type: Part; Design Item ID: R-6.49M-0603; Value: 6.49M; Composition: Thick Film; Features: Automotive AEC-Q200; Operating Temperature: -55°C ~ 155°C; Height - Seated (Max): 0.50mm; Category: Resistor
footprint R0603
pins: 1, 2

## R-6.49R-0603
designator R?, comment Package: 0603  (hidden comment: 6.49R)